# Altium footprint library Connector - FPC.PcbLib: 38 footprints (part 3 of 3)
Each footprint in its own frame and in the unit in brackets; x right, y up, seen from the top. Pads: shape width x height; smd on the part's side, far side on the other; paste and mask are expansions set on the pad; w line width, h text height; cw(c..) or ccw(c..) is an arc to the next point about the centre after c.
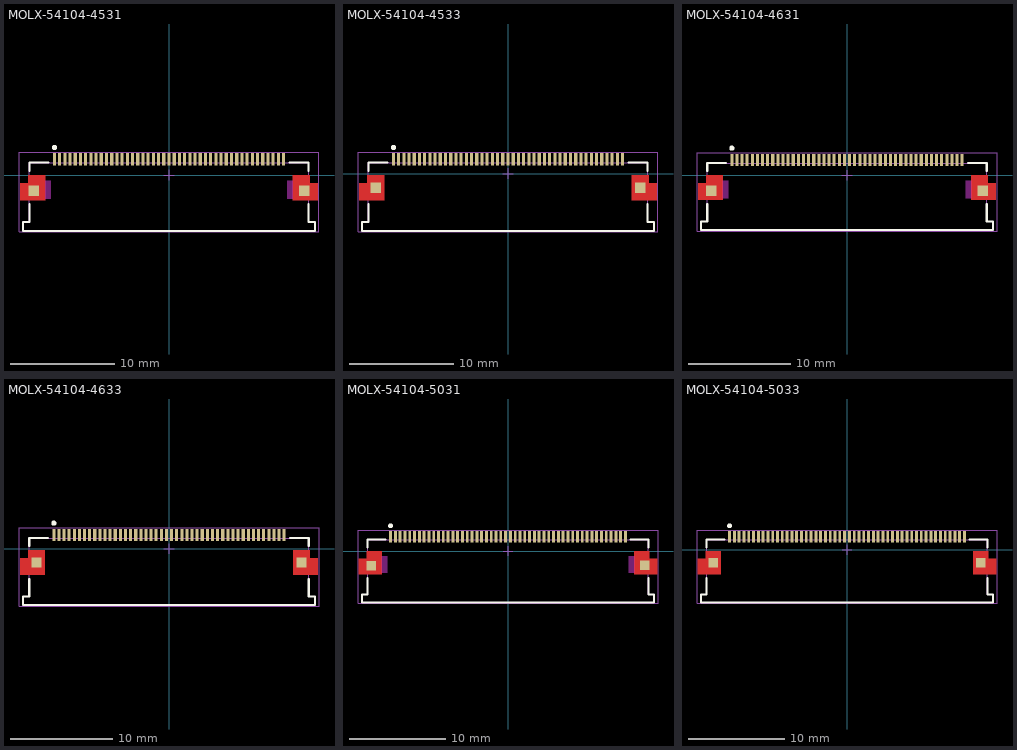
[diagram p2: the footprints below, top view; thin cyan lines are the x and y axes]

## MOLX-54104-4531 [mm] "FPC Connector, 45-Leads, Right Angle, Pitch 0.5 mm, Mated Height 2.0 mm, SMT"
height 2.062
pads (47):
  rect 0.3x1.2 smd: 1(-11,1.5) 2(-10.5,1.5) 3(-10,1.5) 4(-9.5,1.5) 5(-9,1.5) 6(-8.5,1.5) 7(-8,1.5) 8(-7.5,1.5) 9(-7,1.5) 10(-6.5,1.5) 11(-6,1.5) 12(-5.5,1.5) 13(-5,1.5) 14(-4.5,1.5) 15(-4,1.5) 16(-3.5,1.5) 17(-3,1.5) 18(-2.5,1.5) 19(-2,1.5) 20(-1.5,1.5) 21(-1,1.5) 22(-0.5,1.5) 23(0,1.5) 24(0.5,1.5) 25(1,1.5) 26(1.5,1.5) 27(2,1.5) 28(2.5,1.5) 29(3,1.5) 30(3.5,1.5) 31(4,1.5) 32(4.5,1.5) 33(5,1.5) 34(5.5,1.5) 35(6,1.5) 36(6.5,1.5) 37(7,1.5) 38(7.5,1.5) 39(8,1.5) 40(8.5,1.5) 41(9,1.5) 42(9.5,1.5) 43(10,1.5) 44(10.5,1.5) 45(11,1.5)
  rect 1x1 smd: MP1(-13,-1.5) MP2(13,-1.5)
Top Layer:
  region: 11.9,0 13.5,0 13.5,-0.8 14.3,-0.8 14.3,-2.4 11.9,-2.4
  region: -11.9,0 -13.5,0 -13.5,-0.8 -14.3,-0.8 -14.3,-2.4 -11.9,-2.4
Top Overlay:
  circle w0.25: c-11,2.65 r0.125
  lines w0.2: -14,-5.35 14,-5.35 14,-4.5 13.4,-4.5 13.4,-2.8 ; -14,-5.35 -14,-4.5 -13.4,-4.5 -13.4,-2.8 ; -13.4,0.4 -13.4,1.2 -11.55,1.2 ; 11.55,1.2 13.4,1.2 13.4,0.4
Keep-Out Layer:
  region: 11.9,-0.55 11.35,-0.55 11.35,-2.25 11.9,-2.25
  region: -11.35,-0.55 -11.9,-0.55 -11.9,-2.25 -11.35,-2.25
Mechanical 13:
  lines w0.1: -14,-5.35 -14,-4.5 -13.4,-4.5 -13.4,1.2 13.4,1.2 13.4,-4.5 14,-4.5 14,-5.35 -14,-5.35
Mechanical 15:
  lines w0.05: -14.4,-5.45 14.4,-5.45 14.4,2.2 -14.4,2.2 -14.4,-5.45
  lines w0.1: -0.5,0 0.5,0 ; 0,-0.5 0,0.5
3D body "541044531.stp": height 2.06, standoff 0.01, extent -14,-5.35 14,1.8

## MOLX-54104-4533 [mm] "FPC Connector, 45-Leads, Right Angle, Pitch 0.5 mm, Mated Height 2.0 mm, SMT"
height 2.062
pads (47):
  rect 0.3x1.2 smd: 1(-11,1.35) 2(-10.5,1.35) 3(-10,1.35) 4(-9.5,1.35) 5(-9,1.35) 6(-8.5,1.35) 7(-8,1.35) 8(-7.5,1.35) 9(-7,1.35) 10(-6.5,1.35) 11(-6,1.35) 12(-5.5,1.35) 13(-5,1.35) 14(-4.5,1.35) 15(-4,1.35) 16(-3.5,1.35) 17(-3,1.35) 18(-2.5,1.35) 19(-2,1.35) 20(-1.5,1.35) 21(-1,1.35) 22(-0.5,1.35) 23(0,1.35) 24(0.5,1.35) 25(1,1.35) 26(1.5,1.35) 27(2,1.35) 28(2.5,1.35) 29(3,1.35) 30(3.5,1.35) 31(4,1.35) 32(4.5,1.35) 33(5,1.35) 34(5.5,1.35) 35(6,1.35) 36(6.5,1.35) 37(7,1.35) 38(7.5,1.35) 39(8,1.35) 40(8.5,1.35) 41(9,1.35) 42(9.5,1.35) 43(10,1.35) 44(10.5,1.35) 45(11,1.35)
  rect 1x1 smd mask+0: MP1(-12.7,-1.35) MP2(12.7,-1.35)
Top Layer:
  region: 11.9,-2.55 11.9,-0.15 13.5,-0.15 13.5,-0.95 14.3,-0.95 14.3,-2.55
  region: -11.9,-2.55 -11.9,-0.15 -13.5,-0.15 -13.5,-0.95 -14.3,-0.95 -14.3,-2.55
Top Overlay:
  circle w0.25: c-11,2.5 r0.125
  lines w0.2: -13.4,-2.95 -13.4,-4.65 -14,-4.65 -14,-5.5 14,-5.5 14,-4.65 13.4,-4.65 13.4,-2.95 ; -13.4,0.25 -13.4,1.05 -11.55,1.05 ; 11.55,1.05 13.4,1.05 13.4,0.25
Mechanical 13:
  lines w0.1: -14,-5.5 14,-5.5 14,-4.65 13.4,-4.65 13.4,1.05 -13.4,1.05 -13.4,-4.65 -14,-4.65 -14,-5.5
Mechanical 15:
  lines w0.05: -14.4,-5.6 14.4,-5.6 14.4,2.05 -14.4,2.05 -14.4,-5.6
  lines w0.1: -0.5,0 0.5,0 ; 0,-0.5 0,0.5
3D body "541044533.stp": height 2.06, standoff 0.01, extent -14,-5.5 14,1.65

## MOLX-54104-4631 [mm] "FPC Connector, 46-Leads, Right Angle, Pitch 0.5 mm, Mated Height 2.0 mm, SMT"
height 2.062
pads (48):
  rect 0.3x1.2 smd: 1(-11.25,1.5) 2(-10.75,1.5) 3(-10.25,1.5) 4(-9.75,1.5) 5(-9.25,1.5) 6(-8.75,1.5) 7(-8.25,1.5) 8(-7.75,1.5) 9(-7.25,1.5) 10(-6.75,1.5) 11(-6.25,1.5) 12(-5.75,1.5) 13(-5.25,1.5) 14(-4.75,1.5) 15(-4.25,1.5) 16(-3.75,1.5) 17(-3.25,1.5) 18(-2.75,1.5) 19(-2.25,1.5) 20(-1.75,1.5) 21(-1.25,1.5) 22(-0.75,1.5) 23(-0.25,1.5) 24(0.25,1.5) 25(0.75,1.5) 26(1.25,1.5) 27(1.75,1.5) 28(2.25,1.5) 29(2.75,1.5) 30(3.25,1.5) 31(3.75,1.5) 32(4.25,1.5) 33(4.75,1.5) 34(5.25,1.5) 35(5.75,1.5) 36(6.25,1.5) 37(6.75,1.5) 38(7.25,1.5) 39(7.75,1.5) 40(8.25,1.5) 41(8.75,1.5) 42(9.25,1.5) 43(9.75,1.5) 44(10.25,1.5) 45(10.75,1.5) 46(11.25,1.5)
  rect 1x1 smd: MP1(-13.25,-1.5) MP2(13.25,-1.5)
Top Layer:
  region: -12.15,0 -13.75,0 -13.75,-0.8 -14.55,-0.8 -14.55,-2.4 -12.15,-2.4
  region: 12.15,0 13.75,0 13.75,-0.8 14.55,-0.8 14.55,-2.4 12.15,-2.4
Top Overlay:
  circle w0.25: c-11.25,2.65 r0.125
  lines w0.2: -14.25,-5.35 14.25,-5.35 14.25,-4.5 13.65,-4.5 13.65,-2.8 ; -14.25,-5.35 -14.25,-4.5 -13.65,-4.5 -13.65,-2.8 ; -13.65,0.4 -13.65,1.2 -11.8,1.2 ; 11.8,1.2 13.65,1.2 13.65,0.4
Keep-Out Layer:
  region: -11.6,-0.55 -12.15,-0.55 -12.15,-2.25 -11.6,-2.25
  region: 12.15,-0.55 11.6,-0.55 11.6,-2.25 12.15,-2.25
Mechanical 13:
  lines w0.1: -14.25,-5.35 14.25,-5.35 14.25,-4.5 13.65,-4.5 13.65,1.2 -13.65,1.2 -13.65,-4.5 -14.25,-4.5 -14.25,-5.35
Mechanical 15:
  lines w0.05: -14.65,-5.45 -14.65,2.2 14.65,2.2 14.65,-5.45 -14.65,-5.45
  lines w0.1: -0.5,0 0.5,0 ; 0,-0.5 0,0.5
3D body "541044631.stp": height 2.06, standoff 0.01, extent -14.25,-5.35 14.25,1.8

## MOLX-54104-4633 [mm] "FPC Connector, 46-Leads, Right Angle, Pitch 0.5 mm, Mated Height 2.0 mm, SMT"
height 2.062
pads (48):
  rect 0.3x1.2 smd: 1(-11.25,1.35) 2(-10.75,1.35) 3(-10.25,1.35) 4(-9.75,1.35) 5(-9.25,1.35) 6(-8.75,1.35) 7(-8.25,1.35) 8(-7.75,1.35) 9(-7.25,1.35) 10(-6.75,1.35) 11(-6.25,1.35) 12(-5.75,1.35) 13(-5.25,1.35) 14(-4.75,1.35) 15(-4.25,1.35) 16(-3.75,1.35) 17(-3.25,1.35) 18(-2.75,1.35) 19(-2.25,1.35) 20(-1.75,1.35) 21(-1.25,1.35) 22(-0.75,1.35) 23(-0.25,1.35) 24(0.25,1.35) 25(0.75,1.35) 26(1.25,1.35) 27(1.75,1.35) 28(2.25,1.35) 29(2.75,1.35) 30(3.25,1.35) 31(3.75,1.35) 32(4.25,1.35) 33(4.75,1.35) 34(5.25,1.35) 35(5.75,1.35) 36(6.25,1.35) 37(6.75,1.35) 38(7.25,1.35) 39(7.75,1.35) 40(8.25,1.35) 41(8.75,1.35) 42(9.25,1.35) 43(9.75,1.35) 44(10.25,1.35) 45(10.75,1.35) 46(11.25,1.35)
  rect 1x1 smd mask+0: MP1(-12.95,-1.35) MP2(12.95,-1.35)
Top Layer:
  region: 12.15,-2.55 12.15,-0.15 13.75,-0.15 13.75,-0.95 14.55,-0.95 14.55,-2.55
  region: -12.15,-2.55 -12.15,-0.15 -13.75,-0.15 -13.75,-0.95 -14.55,-0.95 -14.55,-2.55
Top Overlay:
  circle w0.25: c-11.25,2.5 r0.125
  lines w0.2: -13.65,-2.95 -13.65,-4.65 -14.25,-4.65 -14.25,-5.5 14.25,-5.5 14.25,-4.65 13.65,-4.65 13.65,-2.95 ; -13.65,0.25 -13.65,1.05 -11.8,1.05 ; 11.8,1.05 13.65,1.05 13.65,0.25
Mechanical 13:
  lines w0.1: -14.25,-5.5 14.25,-5.5 14.25,-4.65 13.65,-4.65 13.65,1.05 -13.65,1.05 -13.65,-4.65 -14.25,-4.65 -14.25,-5.5
Mechanical 15:
  lines w0.05: -14.65,-5.6 14.65,-5.6 14.65,2.05 -14.65,2.05 -14.65,-5.6
  lines w0.1: -0.5,0 0.5,0 ; 0,-0.5 0,0.5
3D body "541044633.stp": height 2.06, standoff 0.01, extent -14.25,-5.5 14.25,1.65

## MOLX-54104-5031 [mm] "FPC Connector, 50-Leads, Right Angle, Pitch 0.5 mm, Mated Height 2.0 mm, SMT"
height 2.062
pads (52):
  rect 0.3x1.2 smd: 1(-12.25,1.5) 2(-11.75,1.5) 3(-11.25,1.5) 4(-10.75,1.5) 5(-10.25,1.5) 6(-9.75,1.5) 7(-9.25,1.5) 8(-8.75,1.5) 9(-8.25,1.5) 10(-7.75,1.5) 11(-7.25,1.5) 12(-6.75,1.5) 13(-6.25,1.5) 14(-5.75,1.5) 15(-5.25,1.5) 16(-4.75,1.5) 17(-4.25,1.5) 18(-3.75,1.5) 19(-3.25,1.5) 20(-2.75,1.5) 21(-2.25,1.5) 22(-1.75,1.5) 23(-1.25,1.5) 24(-0.75,1.5) 25(-0.25,1.5) 26(0.25,1.5) 27(0.75,1.5) 28(1.25,1.5) 29(1.75,1.5) 30(2.25,1.5) 31(2.75,1.5) 32(3.25,1.5) 33(3.75,1.5) 34(4.25,1.5) 35(4.75,1.5) 36(5.25,1.5) 37(5.75,1.5) 38(6.25,1.5) 39(6.75,1.5) 40(7.25,1.5) 41(7.75,1.5) 42(8.25,1.5) 43(8.75,1.5) 44(9.25,1.5) 45(9.75,1.5) 46(10.25,1.5) 47(10.75,1.5) 48(11.25,1.5) 49(11.75,1.5) 50(12.25,1.5)
  rect 1x1 smd: MP1(-14.25,-1.5) MP2(14.25,-1.475)
Top Layer:
  region: 13.15,0 14.75,0 14.75,-0.8 15.55,-0.8 15.55,-2.4 13.15,-2.4
  region: -13.15,0 -14.75,0 -14.75,-0.8 -15.55,-0.8 -15.55,-2.4 -13.15,-2.4
Top Overlay:
  circle w0.25: c-12.25,2.65 r0.125
  lines w0.2: -15.25,-5.35 15.25,-5.35 15.25,-4.5 14.65,-4.5 14.65,-2.8 ; -15.25,-5.35 -15.25,-4.5 -14.65,-4.5 -14.65,-2.8 ; -14.65,0.4 -14.65,1.2 -12.8,1.2 ; 12.8,1.2 14.65,1.2 14.65,0.4
Keep-Out Layer:
  region: 13.15,-0.55 12.6,-0.55 12.6,-2.25 13.15,-2.25
  region: -12.6,-0.55 -13.15,-0.55 -13.15,-2.25 -12.6,-2.25
Mechanical 13:
  lines w0.1: -15.25,-5.35 -15.25,-4.5 -14.65,-4.5 -14.65,1.2 14.65,1.2 14.65,-4.5 15.25,-4.5 15.25,-5.35 -15.25,-5.35
Mechanical 15:
  lines w0.05: -15.65,-5.45 15.65,-5.45 15.65,2.2 -15.65,2.2 -15.65,-5.45
  lines w0.1: -0.5,0 0.5,0 ; 0,-0.5 0,0.5
3D body "541045031.stp": height 2.06, standoff 0.01, extent -15.25,-5.35 15.25,1.8

## MOLX-54104-5033 [mm] "FPC Connector, 50-Leads, Right Angle, Pitch 0.5 mm, Mated Height 2.0 mm, SMT"
height 2.062
pads (52):
  rect 0.3x1.2 smd: 1(-12.25,1.35) 2(-11.75,1.35) 3(-11.25,1.35) 4(-10.75,1.35) 5(-10.25,1.35) 6(-9.75,1.35) 7(-9.25,1.35) 8(-8.75,1.35) 9(-8.25,1.35) 10(-7.75,1.35) 11(-7.25,1.35) 12(-6.75,1.35) 13(-6.25,1.35) 14(-5.75,1.35) 15(-5.25,1.35) 16(-4.75,1.35) 17(-4.25,1.35) 18(-3.75,1.35) 19(-3.25,1.35) 20(-2.75,1.35) 21(-2.25,1.35) 22(-1.75,1.35) 23(-1.25,1.35) 24(-0.75,1.35) 25(-0.25,1.35) 26(0.25,1.35) 27(0.75,1.35) 28(1.25,1.35) 29(1.75,1.35) 30(2.25,1.35) 31(2.75,1.35) 32(3.25,1.35) 33(3.75,1.35) 34(4.25,1.35) 35(4.75,1.35) 36(5.25,1.35) 37(5.75,1.35) 38(6.25,1.35) 39(6.75,1.35) 40(7.25,1.35) 41(7.75,1.35) 42(8.25,1.35) 43(8.75,1.35) 44(9.25,1.35) 45(9.75,1.35) 46(10.25,1.35) 47(10.75,1.35) 48(11.25,1.35) 49(11.75,1.35) 50(12.25,1.35)
  rect 1x1 smd mask+0: MP1(-13.95,-1.35) MP2(13.95,-1.35)
Top Layer:
  region: 13.15,-2.55 13.15,-0.15 14.75,-0.15 14.75,-0.95 15.55,-0.95 15.55,-2.55
  region: -13.15,-2.55 -13.15,-0.15 -14.75,-0.15 -14.75,-0.95 -15.55,-0.95 -15.55,-2.55
Top Overlay:
  circle w0.25: c-12.25,2.5 r0.125
  lines w0.2: -14.65,-2.95 -14.65,-4.65 -15.25,-4.65 -15.25,-5.5 15.25,-5.5 15.25,-4.65 14.65,-4.65 14.65,-2.95 ; -14.65,0.25 -14.65,1.05 -12.8,1.05 ; 12.8,1.05 14.65,1.05 14.65,0.25
Mechanical 13:
  lines w0.1: -15.25,-5.5 15.25,-5.5 15.25,-4.65 14.65,-4.65 14.65,1.05 -14.65,1.05 -14.65,-4.65 -15.25,-4.65 -15.25,-5.5
Mechanical 15:
  lines w0.05: -15.65,-5.6 15.65,-5.6 15.65,2.05 -15.65,2.05 -15.65,-5.6
  lines w0.1: -0.5,0 0.5,0 ; 0,-0.5 0,0.5
3D body "541045033.stp": height 2.06, standoff 0.01, extent -15.25,-5.5 15.25,1.65